# Altium footprint library IC.PCBLIB: 359 footprints (part 3 of 23)
Each footprint in its own frame and in the unit in brackets; x right, y up, seen from the top. Pads: shape width x height; smd on the part's side, far side on the other; paste and mask are expansions set on the pad; w line width, h text height; cw(c..) or ccw(c..) is an arc to the next point about the centre after c.
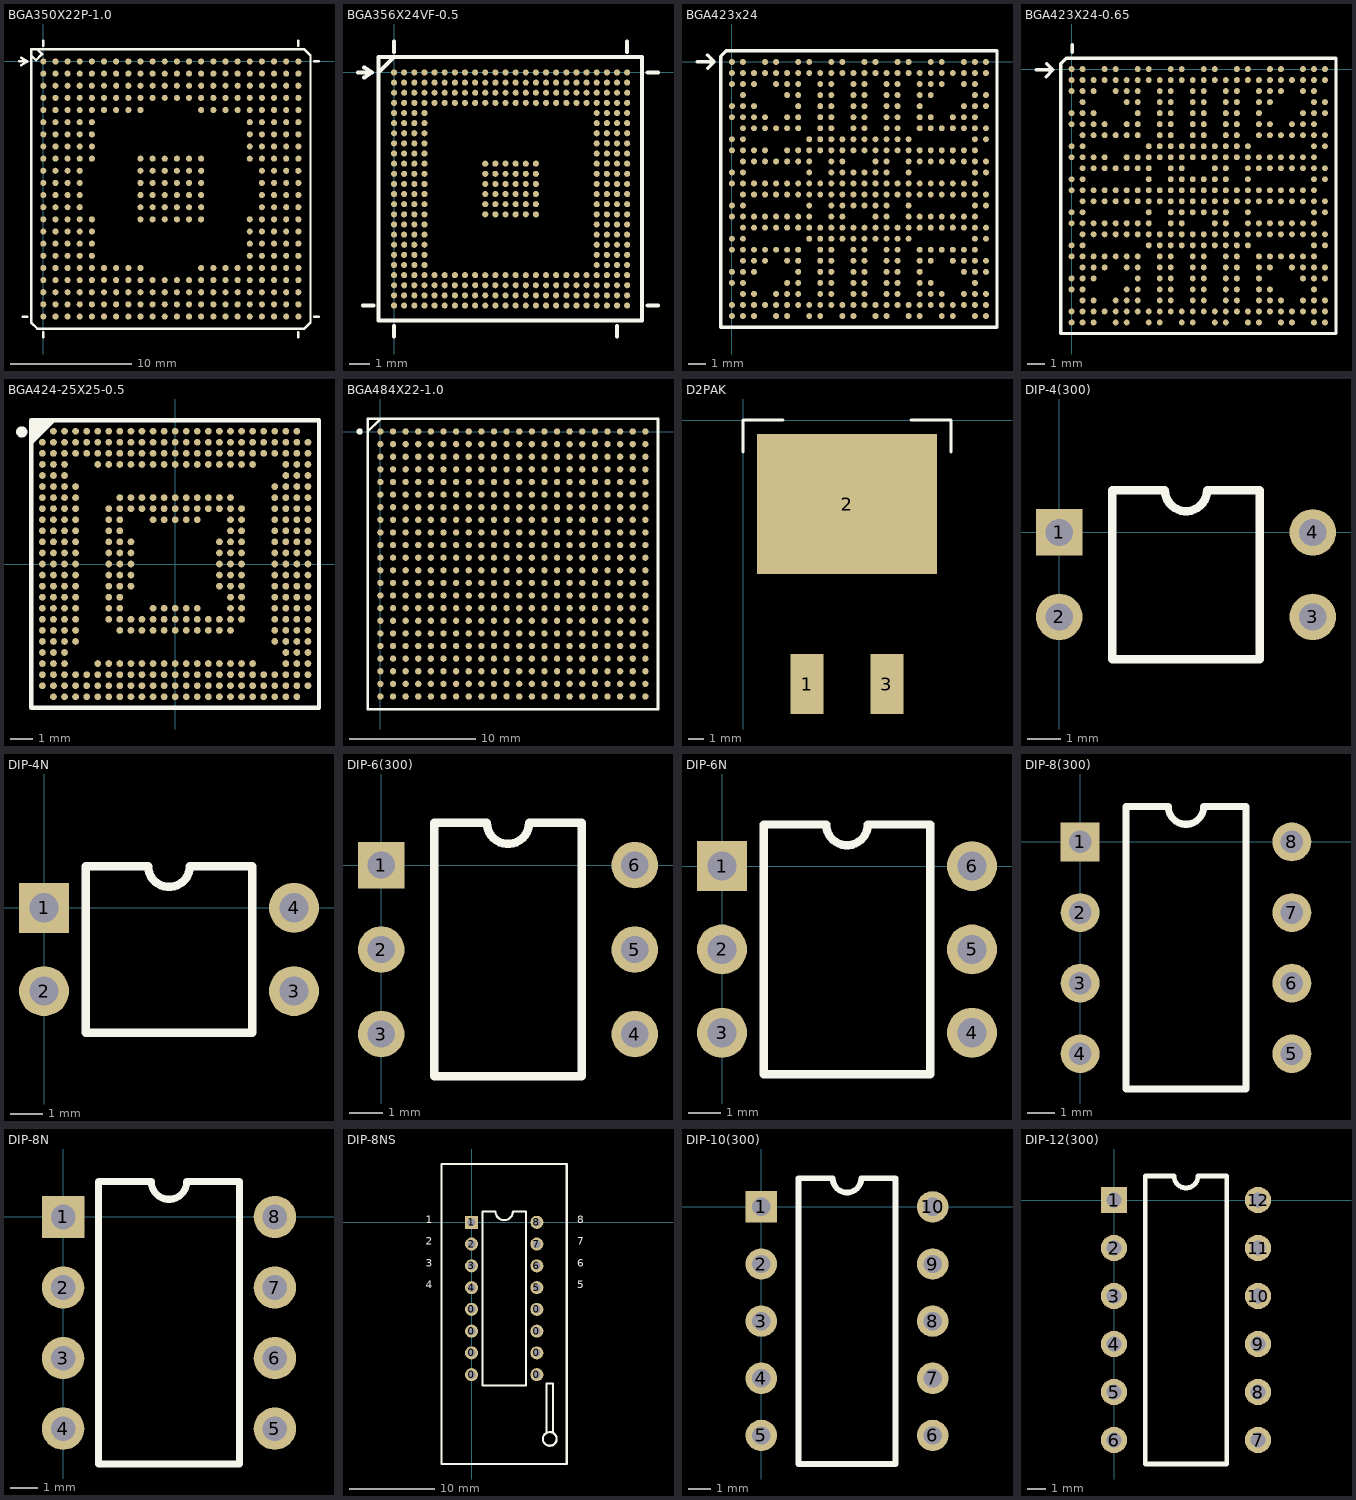
[diagram p2: the footprints below, top view; thin cyan lines are the x and y axes]

## BGA350X22P-1.0 [mm]
height 1.524
pads (360):
  round 0.5 smd: A1(0,0) A2(1,0) A3(2,0) A4(3,0) A5(4,0) A6(5,0) A7(6,0) A8(7,0) A9(8,0) A10(9,0) A11(10,0) A12(11,0) A13(12,0) A14(13,0) A15(14,0) A16(15,0) A17(16,0) A18(17,0) A19(18,0) A20(19,0) A21(20,0) A22(21,0) AA1(0,-20) AA2(1,-20) AA3(2,-20) AA4(3,-20) AA5(4,-20) AA6(5,-20) AA7(6,-20) AA8(7,-20) AA9(8,-20) AA10(9,-20) AA11(10,-20) AA12(11,-20) AA13(12,-20) AA14(13,-20) AA15(14,-20) AA16(15,-20) AA17(16,-20) AA18(17,-20) AA19(18,-20) AA20(19,-20) AA21(20,-20) AA22(21,-20) AB1(0,-21) AB2(1,-21) AB3(2,-21) AB4(3,-21) AB5(4,-21) AB6(5,-21) AB7(6,-21) AB8(7,-21) AB9(8,-21) AB10(9,-21) AB11(10,-21) AB12(11,-21) AB13(12,-21) AB14(13,-21) AB15(14,-21) AB16(15,-21) AB17(16,-21) AB18(17,-21) AB19(18,-21) AB20(19,-21) AB21(20,-21) AB22(21,-21) B1(0,-1) B2(1,-1) B3(2,-1) B4(3,-1) B5(4,-1) B6(5,-1) B7(6,-1) B8(7,-1) B9(8,-1) B10(9,-1) B11(10,-1) B12(11,-1) B13(12,-1) B14(13,-1) B15(14,-1) B16(15,-1) B17(16,-1) B18(17,-1) B19(18,-1) B20(19,-1) B21(20,-1) B22(21,-1) C1(0,-2) C2(1,-2) C3(2,-2) C4(3,-2) C5(4,-2) C6(5,-2) C7(6,-2) C8(7,-2) C9(8,-2) C10(9,-2) C11(10,-2) C12(11,-2) C13(12,-2) C14(13,-2) C15(14,-2) C16(15,-2) C17(16,-2) C18(17,-2) C19(18,-2) C20(19,-2) C21(20,-2) C22(21,-2) D1(0,-3) D2(1,-3) D3(2,-3) D4(3,-3) D5(4,-3) D6(5,-3) D7(6,-3) D8(7,-3) D9(8,-3) D10(9,-3) D11(10,-3) D12(11,-3) D13(12,-3) D14(13,-3) D15(14,-3) D16(15,-3) D17(16,-3) D18(17,-3) D19(18,-3) D20(19,-3) D21(20,-3) D22(21,-3) E1(0,-4) E2(1,-4) E3(2,-4) E4(3,-4) E5(4,-4) E6(5,-4) E7(6,-4) E8(7,-4) E9(8,-4) E14(13,-4) E15(14,-4) E16(15,-4) E17(16,-4) E18(17,-4) E19(18,-4) E20(19,-4) E21(20,-4) E22(21,-4) F1(0,-5) F2(1,-5) F3(2,-5) F4(3,-5) F5(4,-5) F18(17,-5) F19(18,-5) F20(19,-5) F21(20,-5) F22(21,-5) G1(0,-6) G2(1,-6) G3(2,-6) G4(3,-6) G5(4,-6) G18(17,-6) G19(18,-6) G20(19,-6) G21(20,-6) G22(21,-6) H1(0,-7) H2(1,-7) H3(2,-7) H4(3,-7) H5(4,-7) H18(17,-7) H19(18,-7) H20(19,-7) H21(20,-7) H22(21,-7) J1(0,-8) J2(1,-8) J3(2,-8) J4(3,-8) J5(4,-8) J9(8,-8) J10(9,-8) J11(10,-8) J12(11,-8) J13(12,-8) J14(13,-8) J18(17,-8) J19(18,-8) J20(19,-8) J21(20,-8) J22(21,-8) K1(0,-9) K2(1,-9) K3(2,-9) K4(3,-9) K9(8,-9) K10(9,-9) K11(10,-9) K12(11,-9) K13(12,-9) K14(13,-9) K19(18,-9) K20(19,-9) K21(20,-9) K22(21,-9) L1(0,-10) L2(1,-10) L3(2,-10) L4(3,-10) L9(8,-10) L10(9,-10) L11(10,-10) L12(11,-10) L13(12,-10) L14(13,-10) L19(18,-10) L20(19,-10) L21(20,-10) L22(21,-10) M1(0,-11) M2(1,-11) M3(2,-11) M4(3,-11) M9(8,-11) M10(9,-11) M11(10,-11) M12(11,-11) M13(12,-11) M14(13,-11) M19(18,-11) M20(19,-11) M21(20,-11) M22(21,-11) N1(0,-12) N2(1,-12) N3(2,-12) N4(3,-12) N9(8,-12) N10(9,-12) N11(10,-12) N12(11,-12) N13(12,-12) N14(13,-12) N19(18,-12) N20(19,-12) N21(20,-12) N22(21,-12) P1(0,-13) P2(1,-13) P3(2,-13) P4(3,-13) P5(4,-13) P9(8,-13) P10(9,-13) P11(10,-13) P12(11,-13) P13(12,-13) P14(13,-13) P18(17,-13) P19(18,-13) P20(19,-13) P21(20,-13) P22(21,-13) R1(0,-14) R2(1,-14) R3(2,-14) R4(3,-14) R5(4,-14) R18(17,-14) R19(18,-14) R20(19,-14) R21(20,-14) R22(21,-14) T1(0,-15) T2(1,-15) T3(2,-15) T4(3,-15) T5(4,-15) T18(17,-15) T19(18,-15) T20(19,-15) T21(20,-15) T22(21,-15) U1(0,-16) U2(1,-16) U3(2,-16) U4(3,-16) U5(4,-16) U18(17,-16) U19(18,-16) U20(19,-16) U21(20,-16) U22(21,-16) V1(0,-17) V2(1,-17) V3(2,-17) V4(3,-17) V5(4,-17) V6(5,-17) V7(6,-17) V8(7,-17) V9(8,-17) V14(13,-17) V15(14,-17) V16(15,-17) V17(16,-17) V18(17,-17) V19(18,-17) V20(19,-17) V21(20,-17) V22(21,-17) W1(0,-18) W2(1,-18) W3(2,-18) W4(3,-18) W5(4,-18) W6(5,-18) W7(6,-18) W8(7,-18) W9(8,-18) W10(9,-18) W11(10,-18) W12(11,-18) W13(12,-18) W14(13,-18) W15(14,-18) W16(15,-18) W17(16,-18) W18(17,-18) W19(18,-18) W20(19,-18) W21(20,-18) W22(21,-18) Y1(0,-19) Y2(1,-19) Y3(2,-19) Y4(3,-19) Y5(4,-19) Y6(5,-19) Y7(6,-19) Y8(7,-19) Y9(8,-19) Y10(9,-19) Y11(10,-19) Y12(11,-19) Y13(12,-19) Y14(13,-19) Y15(14,-19) Y16(15,-19) Y17(16,-19) Y18(17,-19) Y19(18,-19) Y20(19,-19) Y21(20,-19) Y22(21,-19)
TopOverlay:
  lines w0.2: -1,-21.5 -0.5,-22 21.5,-22 22,-21.5 22,0.5 21.5,1 -1,1 -1,-21.5
  lines w0.203: -2,0 -1.3,0 ; -1.8,-0.3 -1.3,0 ; -1.8,0.3 -1.3,0 ; -1.7,-21 -1.3,-21 ; -1,0.5 -0.6,0.1 -0.1,0.6 -0.5,1 ; 0,-22.7 0,-22.3 ; 0,1.3 0,1.7 ; 21,-22.7 21,-22.3 ; 21,1.3 21,1.7 ; 22.3,-21 22.7,-21 ; 22.3,0 22.7,0

## BGA356X24VF-0.5 [mm]
height 1.27
pads (356):
  round 0.3 smd: A1(0,0) A2(0.5,0) A3(1,0) A4(1.5,0) A5(2,0) A6(2.5,0) A7(3,0) A8(3.5,0) A9(4,0) A10(4.5,0) A11(5,0) A12(5.5,0) A13(6,0) A14(6.5,0) A15(7,0) A16(7.5,0) A17(8,0) A18(8.5,0) A19(9,0) A20(9.5,0) A21(10,0) A22(10.5,0) A23(11,0) A24(11.5,0) AA1(0,-10) AA2(0.5,-10) AA3(1,-10) AA4(1.5,-10) AA5(2,-10) AA6(2.5,-10) AA7(3,-10) AA8(3.5,-10) AA9(4,-10) AA10(4.5,-10) AA11(5,-10) AA12(5.5,-10) AA13(6,-10) AA14(6.5,-10) AA15(7,-10) AA16(7.5,-10) AA17(8,-10) AA18(8.5,-10) AA19(9,-10) AA20(9.5,-10) AA21(10,-10) AA22(10.5,-10) AA23(11,-10) AA24(11.5,-10) AB1(0,-10.5) AB2(0.5,-10.5) AB3(1,-10.5) AB4(1.5,-10.5) AB5(2,-10.5) AB6(2.5,-10.5) AB7(3,-10.5) AB8(3.5,-10.5) AB9(4,-10.5) AB10(4.5,-10.5) AB11(5,-10.5) AB12(5.5,-10.5) AB13(6,-10.5) AB14(6.5,-10.5) AB15(7,-10.5) AB16(7.5,-10.5) AB17(8,-10.5) AB18(8.5,-10.5) AB19(9,-10.5) AB20(9.5,-10.5) AB21(10,-10.5) AB22(10.5,-10.5) AB23(11,-10.5) AB24(11.5,-10.5) AC1(0,-11) AC2(0.5,-11) AC3(1,-11) AC4(1.5,-11) AC5(2,-11) AC6(2.5,-11) AC7(3,-11) AC8(3.5,-11) AC9(4,-11) AC10(4.5,-11) AC11(5,-11) AC12(5.5,-11) AC13(6,-11) AC14(6.5,-11) AC15(7,-11) AC16(7.5,-11) AC17(8,-11) AC18(8.5,-11) AC19(9,-11) AC20(9.5,-11) AC21(10,-11) AC22(10.5,-11) AC23(11,-11) AC24(11.5,-11) AD1(0,-11.5) AD2(0.5,-11.5) AD3(1,-11.5) AD4(1.5,-11.5) AD5(2,-11.5) AD6(2.5,-11.5) AD7(3,-11.5) AD8(3.5,-11.5) AD9(4,-11.5) AD10(4.5,-11.5) AD11(5,-11.5) AD12(5.5,-11.5) AD13(6,-11.5) AD14(6.5,-11.5) AD15(7,-11.5) AD16(7.5,-11.5) AD17(8,-11.5) AD18(8.5,-11.5) AD19(9,-11.5) AD20(9.5,-11.5) AD21(10,-11.5) AD22(10.5,-11.5) AD23(11,-11.5) AD24(11.5,-11.5) B1(0,-0.5) B2(0.5,-0.5) B3(1,-0.5) B4(1.5,-0.5) B5(2,-0.5) B6(2.5,-0.5) B7(3,-0.5) B8(3.5,-0.5) B9(4,-0.5) B10(4.5,-0.5) B11(5,-0.5) B12(5.5,-0.5) B13(6,-0.5) B14(6.5,-0.5) B15(7,-0.5) B16(7.5,-0.5) B17(8,-0.5) B18(8.5,-0.5) B19(9,-0.5) B20(9.5,-0.5) B21(10,-0.5) B22(10.5,-0.5) B23(11,-0.5) B24(11.5,-0.5) C1(0,-1) C2(0.5,-1) C3(1,-1) C4(1.5,-1) C5(2,-1) C6(2.5,-1) C7(3,-1) C8(3.5,-1) C9(4,-1) C10(4.5,-1) C11(5,-1) C12(5.5,-1) C13(6,-1) C14(6.5,-1) C15(7,-1) C16(7.5,-1) C17(8,-1) C18(8.5,-1) C19(9,-1) C20(9.5,-1) C21(10,-1) C22(10.5,-1) C23(11,-1) C24(11.5,-1) D1(0,-1.5) D2(0.5,-1.5) D3(1,-1.5) D4(1.5,-1.5) D5(2,-1.5) D6(2.5,-1.5) D7(3,-1.5) D8(3.5,-1.5) D9(4,-1.5) D10(4.5,-1.5) D11(5,-1.5) D12(5.5,-1.5) D13(6,-1.5) D14(6.5,-1.5) D15(7,-1.5) D16(7.5,-1.5) D17(8,-1.5) D18(8.5,-1.5) D19(9,-1.5) D20(9.5,-1.5) D21(10,-1.5) D22(10.5,-1.5) D23(11,-1.5) D24(11.5,-1.5) E1(0,-2) E2(0.5,-2) E3(1,-2) E4(1.5,-2) E21(10,-2) E22(10.5,-2) E23(11,-2) E24(11.5,-2) F1(0,-2.5) F2(0.5,-2.5) F3(1,-2.5) F4(1.5,-2.5) F21(10,-2.5) F22(10.5,-2.5) F23(11,-2.5) F24(11.5,-2.5) G1(0,-3) G2(0.5,-3) G3(1,-3) G4(1.5,-3) G21(10,-3) G22(10.5,-3) G23(11,-3) G24(11.5,-3) H1(0,-3.5) H2(0.5,-3.5) H3(1,-3.5) H4(1.5,-3.5) H21(10,-3.5) H22(10.5,-3.5) H23(11,-3.5) H24(11.5,-3.5) J1(0,-4) J2(0.5,-4) J3(1,-4) J4(1.5,-4) J21(10,-4) J22(10.5,-4) J23(11,-4) J24(11.5,-4) K1(0,-4.5) K2(0.5,-4.5) K3(1,-4.5) K4(1.5,-4.5) K10(4.5,-4.5) K11(5,-4.5) K12(5.5,-4.5) K13(6,-4.5) K14(6.5,-4.5) K15(7,-4.5) K21(10,-4.5) K22(10.5,-4.5) K23(11,-4.5) K24(11.5,-4.5) L1(0,-5) L2(0.5,-5) L3(1,-5) L4(1.5,-5) L10(4.5,-5) L11(5,-5) L12(5.5,-5) L13(6,-5) L14(6.5,-5) L15(7,-5) L21(10,-5) L22(10.5,-5) L23(11,-5) L24(11.5,-5) M1(0,-5.5) M2(0.5,-5.5) M3(1,-5.5) M4(1.5,-5.5) M10(4.5,-5.5) M11(5,-5.5) M12(5.5,-5.5) M13(6,-5.5) M14(6.5,-5.5) M15(7,-5.5) M21(10,-5.5) M22(10.5,-5.5) M23(11,-5.5) M24(11.5,-5.5) N1(0,-6) N2(0.5,-6) N3(1,-6) N4(1.5,-6) N10(4.5,-6) N11(5,-6) N12(5.5,-6) N13(6,-6) N14(6.5,-6) N15(7,-6) N21(10,-6) N22(10.5,-6) N23(11,-6) N24(11.5,-6) P1(0,-6.5) P2(0.5,-6.5) P3(1,-6.5) P4(1.5,-6.5) P10(4.5,-6.5) P11(5,-6.5) P12(5.5,-6.5) P13(6,-6.5) P14(6.5,-6.5) P15(7,-6.5) P21(10,-6.5) P22(10.5,-6.5) P23(11,-6.5) P24(11.5,-6.5) R1(0,-7) R2(0.5,-7) R3(1,-7) R4(1.5,-7) R10(4.5,-7) R11(5,-7) R12(5.5,-7) R13(6,-7) R14(6.5,-7) R15(7,-7) R21(10,-7) R22(10.5,-7) R23(11,-7) R24(11.5,-7) T1(0,-7.5) T2(0.5,-7.5) T3(1,-7.5) T4(1.5,-7.5) T21(10,-7.5) T22(10.5,-7.5) T23(11,-7.5) T24(11.5,-7.5) U1(0,-8) U2(0.5,-8) U3(1,-8) U4(1.5,-8) U21(10,-8) U22(10.5,-8) U23(11,-8) U24(11.5,-8) V1(0,-8.5) V2(0.5,-8.5) V3(1,-8.5) V4(1.5,-8.5) V21(10,-8.5) V22(10.5,-8.5) V23(11,-8.5) V24(11.5,-8.5) W1(0,-9) W2(0.5,-9) W3(1,-9) W4(1.5,-9) W21(10,-9) W22(10.5,-9) W23(11,-9) W24(11.5,-9) Y1(0,-9.5) Y2(0.5,-9.5) Y3(1,-9.5) Y4(1.5,-9.5) Y21(10,-9.5) Y22(10.5,-9.5) Y23(11,-9.5) Y24(11.5,-9.5)
TopOverlay:
  lines w0.203: -1.778,0 -1.092,0 ; -1.524,-11.5 -1.016,-11.5 ; -1.473,-0.254 -1.092,0 ; -1.473,0.254 -1.092,0 ; -0.762,0 0,0.762 ; 0,-13.024 0,-12.516 ; 0,1.016 0,1.524 ; 11,-13.024 11,-12.516 ; 11.5,1.016 11.5,1.524 ; 12.516,-11.5 13.024,-11.5 ; 12.516,0 13.024,0 ; -0.762,-12.243 -0.762,0.762 12.243,0.762 12.243,-12.243 -0.762,-12.243

## BGA423x24 [mm]
pads (423):
  round 0.35 smd: A1(0,0) A2(0.65,0) A4(1.95,0) A5(2.6,0) A7(3.9,0) A8(4.55,0) A10(5.85,0) A11(6.5,0) A13(7.8,0) A14(8.45,0) A16(9.75,0) A17(10.4,0) A19(11.7,0) A20(12.35,0) A22(13.65,0) A23(14.3,0) A24(14.95,0) AA1(0,-13) AA2(0.65,-13) AA6(3.25,-13) AA7(3.9,-13) AA9(5.2,-13) AA10(5.85,-13) AA12(7.15,-13) AA13(7.8,-13) AA15(9.1,-13) AA16(9.75,-13) AA18(11.05,-13) AA19(11.7,-13) AA23(14.3,-13) AB2(0.65,-13.65) AB3(1.3,-13.65) AB5(2.6,-13.65) AB6(3.25,-13.65) AB7(3.9,-13.65) AB9(5.2,-13.65) AB10(5.85,-13.65) AB12(7.15,-13.65) AB13(7.8,-13.65) AB15(9.1,-13.65) AB16(9.75,-13.65) AB18(11.05,-13.65) AB19(11.7,-13.65) AB20(12.35,-13.65) AB22(13.65,-13.65) AB23(14.3,-13.65) AB24(14.95,-13.65) AC1(0,-14.3) AC2(0.65,-14.3) AC3(1.3,-14.3) AC4(1.95,-14.3) AC5(2.6,-14.3) AC6(3.25,-14.3) AC7(3.9,-14.3) AC8(4.55,-14.3) AC9(5.2,-14.3) AC10(5.85,-14.3) AC11(6.5,-14.3) AC12(7.15,-14.3) AC13(7.8,-14.3) AC14(8.45,-14.3) AC15(9.1,-14.3) AC16(9.75,-14.3) AC17(10.4,-14.3) AC18(11.05,-14.3) AC19(11.7,-14.3) AC20(12.35,-14.3) AC21(13,-14.3) AC22(13.65,-14.3) AC23(14.3,-14.3) AC24(14.95,-14.3) AD1(0,-14.95) AD2(0.65,-14.95) AD3(1.3,-14.95) AD5(2.6,-14.95) AD6(3.25,-14.95) AD8(4.55,-14.95) AD9(5.2,-14.95) AD11(6.5,-14.95) AD12(7.15,-14.95) AD14(8.45,-14.95) AD15(9.1,-14.95) AD17(10.4,-14.95) AD18(11.05,-14.95) AD20(12.35,-14.95) AD21(13,-14.95) AD23(14.3,-14.95) AD24(14.95,-14.95) B1(0,-0.65) B2(0.65,-0.65) B3(1.3,-0.65) B4(1.95,-0.65) B5(2.6,-0.65) B6(3.25,-0.65) B7(3.9,-0.65) B8(4.55,-0.65) B9(5.2,-0.65) B10(5.85,-0.65) B11(6.5,-0.65) B12(7.15,-0.65) B13(7.8,-0.65) B14(8.45,-0.65) B15(9.1,-0.65) B16(9.75,-0.65) B17(10.4,-0.65) B18(11.05,-0.65) B19(11.7,-0.65) B20(12.35,-0.65) B21(13,-0.65) B22(13.65,-0.65) B23(14.3,-0.65) B24(14.95,-0.65) C1(0,-1.3) C2(0.65,-1.3) C3(1.3,-1.3) C5(2.6,-1.3) C6(3.25,-1.3) C7(3.9,-1.3) C9(5.2,-1.3) C10(5.85,-1.3) C12(7.15,-1.3) C13(7.8,-1.3) C15(9.1,-1.3) C16(9.75,-1.3) C18(11.05,-1.3) C19(11.7,-1.3) C20(12.35,-1.3) C22(13.65,-1.3) C23(14.3,-1.3) D2(0.65,-1.95) D6(3.25,-1.95) D7(3.9,-1.95) D9(5.2,-1.95) D10(5.85,-1.95) D12(7.15,-1.95) D13(7.8,-1.95) D15(9.1,-1.95) D16(9.75,-1.95) D18(11.05,-1.95) D19(11.7,-1.95) D23(14.3,-1.95) D24(14.95,-1.95) E1(0,-2.6) E2(0.65,-2.6) E3(1.3,-2.6) E7(3.9,-2.6) E9(5.2,-2.6) E10(5.85,-2.6) E12(7.15,-2.6) E13(7.8,-2.6) E15(9.1,-2.6) E16(9.75,-2.6) E18(11.05,-2.6) E22(13.65,-2.6) E23(14.3,-2.6) E24(14.95,-2.6) F1(0,-3.25) F2(0.65,-3.25) F3(1.3,-3.25) F4(1.95,-3.25) F6(3.25,-3.25) F7(3.9,-3.25) F9(5.2,-3.25) F10(5.85,-3.25) F12(7.15,-3.25) F13(7.8,-3.25) F15(9.1,-3.25) F16(9.75,-3.25) F18(11.05,-3.25) F19(11.7,-3.25) F21(13,-3.25) F22(13.65,-3.25) F23(14.3,-3.25) G2(0.65,-3.9) G3(1.3,-3.9) G4(1.95,-3.9) G5(2.6,-3.9) G6(3.25,-3.9) G7(3.9,-3.9) G9(5.2,-3.9) G10(5.85,-3.9) G12(7.15,-3.9) G13(7.8,-3.9) G15(9.1,-3.9) G16(9.75,-3.9) G18(11.05,-3.9) G19(11.7,-3.9) G20(12.35,-3.9) G21(13,-3.9) G22(13.65,-3.9) G23(14.3,-3.9) G24(14.95,-3.9) H1(0,-4.55) H2(0.65,-4.55) H8(4.55,-4.55) H9(5.2,-4.55) H10(5.85,-4.55) H11(6.5,-4.55) H12(7.15,-4.55) H13(7.8,-4.55) H14(8.45,-4.55) H15(9.1,-4.55) H16(9.75,-4.55) H17(10.4,-4.55) H23(14.3,-4.55) H24(14.95,-4.55) J1(0,-5.2) J2(0.65,-5.2) J3(1.3,-5.2) J4(1.95,-5.2) J6(3.25,-5.2) J7(3.9,-5.2) J8(4.55,-5.2) J9(5.2,-5.2) J10(5.85,-5.2) J11(6.5,-5.2) J12(7.15,-5.2) J13(7.8,-5.2) J14(8.45,-5.2) J15(9.1,-5.2) J16(9.75,-5.2) J17(10.4,-5.2) J18(11.05,-5.2) J19(11.7,-5.2) J20(12.35,-5.2) J21(13,-5.2) J22(13.65,-5.2) J23(14.3,-5.2) K2(0.65,-5.85) K3(1.3,-5.85) K4(1.95,-5.85) K5(2.6,-5.85) K6(3.25,-5.85) K7(3.9,-5.85) K8(4.55,-5.85) K10(5.85,-5.85) K11(6.5,-5.85) K14(8.45,-5.85) K15(9.1,-5.85) K17(10.4,-5.85) K18(11.05,-5.85) K19(11.7,-5.85) K20(12.35,-5.85) K21(13,-5.85) K22(13.65,-5.85) K23(14.3,-5.85) K24(14.95,-5.85) L1(0,-6.5) L2(0.65,-6.5) L8(4.55,-6.5) L10(5.85,-6.5) L11(6.5,-6.5) L12(7.15,-6.5) L13(7.8,-6.5) L14(8.45,-6.5) L15(9.1,-6.5) L17(10.4,-6.5) L23(14.3,-6.5) L24(14.95,-6.5) M1(0,-7.15) M2(0.65,-7.15) M3(1.3,-7.15) M4(1.95,-7.15) M5(2.6,-7.15) M6(3.25,-7.15) M7(3.9,-7.15) M8(4.55,-7.15) M9(5.2,-7.15) M10(5.85,-7.15) M11(6.5,-7.15) M12(7.15,-7.15) M13(7.8,-7.15) M14(8.45,-7.15) M15(9.1,-7.15) M16(9.75,-7.15) M17(10.4,-7.15) M18(11.05,-7.15) M19(11.7,-7.15) M20(12.35,-7.15) M21(13,-7.15) M22(13.65,-7.15) M23(14.3,-7.15) N2(0.65,-7.8) N3(1.3,-7.8) N4(1.95,-7.8) N5(2.6,-7.8) N6(3.25,-7.8) N7(3.9,-7.8) N8(4.55,-7.8) N9(5.2,-7.8) N10(5.85,-7.8) N11(6.5,-7.8) N12(7.15,-7.8) N13(7.8,-7.8) N14(8.45,-7.8) N15(9.1,-7.8) N16(9.75,-7.8) N17(10.4,-7.8) N18(11.05,-7.8) N19(11.7,-7.8) N20(12.35,-7.8) N21(13,-7.8) N22(13.65,-7.8) N23(14.3,-7.8) N24(14.95,-7.8) P1(0,-8.45) P2(0.65,-8.45) P8(4.55,-8.45) P10(5.85,-8.45) P11(6.5,-8.45) P12(7.15,-8.45) P13(7.8,-8.45) P14(8.45,-8.45) P15(9.1,-8.45) P17(10.4,-8.45) P23(14.3,-8.45) P24(14.95,-8.45) R1(0,-9.1) R2(0.65,-9.1) R3(1.3,-9.1) R4(1.95,-9.1) R5(2.6,-9.1) R6(3.25,-9.1) R7(3.9,-9.1) R8(4.55,-9.1) R10(5.85,-9.1) R11(6.5,-9.1) R14(8.45,-9.1) R15(9.1,-9.1) R17(10.4,-9.1) R18(11.05,-9.1) R19(11.7,-9.1) R20(12.35,-9.1) R21(13,-9.1) R22(13.65,-9.1) R23(14.3,-9.1) T2(0.65,-9.75) T3(1.3,-9.75) T4(1.95,-9.75) T5(2.6,-9.75) T6(3.25,-9.75) T7(3.9,-9.75) T8(4.55,-9.75) T9(5.2,-9.75) T10(5.85,-9.75) T11(6.5,-9.75) T12(7.15,-9.75) T13(7.8,-9.75) T14(8.45,-9.75) T15(9.1,-9.75) T16(9.75,-9.75) T17(10.4,-9.75) T18(11.05,-9.75) T19(11.7,-9.75) T20(12.35,-9.75) T21(13,-9.75) T22(13.65,-9.75) T23(14.3,-9.75) T24(14.95,-9.75) U1(0,-10.4) U2(0.65,-10.4) U8(4.55,-10.4) U9(5.2,-10.4) U10(5.85,-10.4) U11(6.5,-10.4) U12(7.15,-10.4) U13(7.8,-10.4) U14(8.45,-10.4) U15(9.1,-10.4) U16(9.75,-10.4) U17(10.4,-10.4) U23(14.3,-10.4) U24(14.95,-10.4) V1(0,-11.05) V2(0.65,-11.05) V3(1.3,-11.05) V4(1.95,-11.05) V5(2.6,-11.05) V6(3.25,-11.05) V7(3.9,-11.05) V9(5.2,-11.05) V10(5.85,-11.05) V12(7.15,-11.05) V13(7.8,-11.05) V15(9.1,-11.05) V16(9.75,-11.05) V18(11.05,-11.05) V19(11.7,-11.05) V20(12.35,-11.05) V21(13,-11.05) V22(13.65,-11.05) V23(14.3,-11.05) W2(0.65,-11.7) W3(1.3,-11.7) W4(1.95,-11.7) W6(3.25,-11.7) W7(3.9,-11.7) W9(5.2,-11.7) W10(5.85,-11.7) W12(7.15,-11.7) W13(7.8,-11.7) W15(9.1,-11.7) W16(9.75,-11.7) W18(11.05,-11.7) W19(11.7,-11.7) W21(13,-11.7) W22(13.65,-11.7) W23(14.3,-11.7) W24(14.95,-11.7) Y1(0,-12.35) Y2(0.65,-12.35) Y3(1.3,-12.35) Y7(3.9,-12.35) Y9(5.2,-12.35) Y10(5.85,-12.35) Y12(7.15,-12.35) Y13(7.8,-12.35) Y15(9.1,-12.35) Y16(9.75,-12.35) Y18(11.05,-12.35) Y22(13.65,-12.35) Y23(14.3,-12.35) Y24(14.95,-12.35)
TopOverlay:
  lines w0.2: -2.054,0.013 -1.054,0.013 ; -1.454,0.413 -1.054,0.013 ; -1.429,-0.362 -1.054,0.013 ; -0.65,-15.6 -0.65,0.325 -0.325,0.65 15.6,0.65 15.6,-15.6 -0.65,-15.6

## BGA423X24-0.65 [mm]
height 1.27
pads (423):
  round 0.35 smd: A1(0,0) A2(0.65,0) A4(1.95,0) A5(2.6,0) A7(3.9,0) A8(4.55,0) A10(5.85,0) A11(6.5,0) A13(7.8,0) A14(8.45,0) A16(9.75,0) A17(10.4,0) A19(11.7,0) A20(12.35,0) A22(13.65,0) A23(14.3,0) A24(14.95,0) AA1(0,-13) AA2(0.65,-13) AA6(3.25,-13) AA7(3.9,-13) AA9(5.2,-13) AA10(5.85,-13) AA12(7.15,-13) AA13(7.8,-13) AA15(9.1,-13) AA16(9.75,-13) AA18(11.05,-13) AA19(11.7,-13) AA23(14.3,-13) AB2(0.65,-13.65) AB3(1.3,-13.65) AB5(2.6,-13.65) AB6(3.25,-13.65) AB7(3.9,-13.65) AB9(5.2,-13.65) AB10(5.85,-13.65) AB12(7.15,-13.65) AB13(7.8,-13.65) AB15(9.1,-13.65) AB16(9.75,-13.65) AB18(11.05,-13.65) AB19(11.7,-13.65) AB20(12.35,-13.65) AB22(13.65,-13.65) AB23(14.3,-13.65) AB24(14.95,-13.65) AC1(0,-14.3) AC2(0.65,-14.3) AC3(1.3,-14.3) AC4(1.95,-14.3) AC5(2.6,-14.3) AC6(3.25,-14.3) AC7(3.9,-14.3) AC8(4.55,-14.3) AC9(5.2,-14.3) AC10(5.85,-14.3) AC11(6.5,-14.3) AC12(7.15,-14.3) AC13(7.8,-14.3) AC14(8.45,-14.3) AC15(9.1,-14.3) AC16(9.75,-14.3) AC17(10.4,-14.3) AC18(11.05,-14.3) AC19(11.7,-14.3) AC20(12.35,-14.3) AC21(13,-14.3) AC22(13.65,-14.3) AC23(14.3,-14.3) AC24(14.95,-14.3) AD1(0,-14.95) AD2(0.65,-14.95) AD3(1.3,-14.95) AD5(2.6,-14.95) AD6(3.25,-14.95) AD8(4.55,-14.95) AD9(5.2,-14.95) AD11(6.5,-14.95) AD12(7.15,-14.95) AD14(8.45,-14.95) AD15(9.1,-14.95) AD17(10.4,-14.95) AD18(11.05,-14.95) AD20(12.35,-14.95) AD21(13,-14.95) AD23(14.3,-14.95) AD24(14.95,-14.95) B1(0,-0.65) B2(0.65,-0.65) B3(1.3,-0.65) B4(1.95,-0.65) B5(2.6,-0.65) B6(3.25,-0.65) B7(3.9,-0.65) B8(4.55,-0.65) B9(5.2,-0.65) B10(5.85,-0.65) B11(6.5,-0.65) B12(7.15,-0.65) B13(7.8,-0.65) B14(8.45,-0.65) B15(9.1,-0.65) B16(9.75,-0.65) B17(10.4,-0.65) B18(11.05,-0.65) B19(11.7,-0.65) B20(12.35,-0.65) B21(13,-0.65) B22(13.65,-0.65) B23(14.3,-0.65) B24(14.95,-0.65) C1(0,-1.3) C2(0.65,-1.3) C3(1.3,-1.3) C5(2.6,-1.3) C6(3.25,-1.3) C7(3.9,-1.3) C9(5.2,-1.3) C10(5.85,-1.3) C12(7.15,-1.3) C13(7.8,-1.3) C15(9.1,-1.3) C16(9.75,-1.3) C18(11.05,-1.3) C19(11.7,-1.3) C20(12.35,-1.3) C22(13.65,-1.3) C23(14.3,-1.3) D2(0.65,-1.95) D6(3.25,-1.95) D7(3.9,-1.95) D9(5.2,-1.95) D10(5.85,-1.95) D12(7.15,-1.95) D13(7.8,-1.95) D15(9.1,-1.95) D16(9.75,-1.95) D18(11.05,-1.95) D19(11.7,-1.95) D23(14.3,-1.95) D24(14.95,-1.95) E1(0,-2.6) E2(0.65,-2.6) E3(1.3,-2.6) E7(3.9,-2.6) E9(5.2,-2.6) E10(5.85,-2.6) E12(7.15,-2.6) E13(7.8,-2.6) E15(9.1,-2.6) E16(9.75,-2.6) E18(11.05,-2.6) E22(13.65,-2.6) E23(14.3,-2.6) E24(14.95,-2.6) F1(0,-3.25) F2(0.65,-3.25) F3(1.3,-3.25) F4(1.95,-3.25) F6(3.25,-3.25) F7(3.9,-3.25) F9(5.2,-3.25) F10(5.85,-3.25) F12(7.15,-3.25) F13(7.8,-3.25) F15(9.1,-3.25) F16(9.75,-3.25) F18(11.05,-3.25) F19(11.7,-3.25) F21(13,-3.25) F22(13.65,-3.25) F23(14.3,-3.25) G2(0.65,-3.9) G3(1.3,-3.9) G4(1.95,-3.9) G5(2.6,-3.9) G6(3.25,-3.9) G7(3.9,-3.9) G9(5.2,-3.9) G10(5.85,-3.9) G12(7.15,-3.9) G13(7.8,-3.9) G15(9.1,-3.9) G16(9.75,-3.9) G18(11.05,-3.9) G19(11.7,-3.9) G20(12.35,-3.9) G21(13,-3.9) G22(13.65,-3.9) G23(14.3,-3.9) G24(14.95,-3.9) H1(0,-4.55) H2(0.65,-4.55) H8(4.55,-4.55) H9(5.2,-4.55) H10(5.85,-4.55) H11(6.5,-4.55) H12(7.15,-4.55) H13(7.8,-4.55) H14(8.45,-4.55) H15(9.1,-4.55) H16(9.75,-4.55) H17(10.4,-4.55) H23(14.3,-4.55) H24(14.95,-4.55) J1(0,-5.2) J2(0.65,-5.2) J3(1.3,-5.2) J4(1.95,-5.2) J6(3.25,-5.2) J7(3.9,-5.2) J8(4.55,-5.2) J9(5.2,-5.2) J10(5.85,-5.2) J11(6.5,-5.2) J12(7.15,-5.2) J13(7.8,-5.2) J14(8.45,-5.2) J15(9.1,-5.2) J16(9.75,-5.2) J17(10.4,-5.2) J18(11.05,-5.2) J19(11.7,-5.2) J20(12.35,-5.2) J21(13,-5.2) J22(13.65,-5.2) J23(14.3,-5.2) K2(0.65,-5.85) K3(1.3,-5.85) K4(1.95,-5.85) K5(2.6,-5.85) K6(3.25,-5.85) K7(3.9,-5.85) K8(4.55,-5.85) K10(5.85,-5.85) K11(6.5,-5.85) K14(8.45,-5.85) K15(9.1,-5.85) K17(10.4,-5.85) K18(11.05,-5.85) K19(11.7,-5.85) K20(12.35,-5.85) K21(13,-5.85) K22(13.65,-5.85) K23(14.3,-5.85) K24(14.95,-5.85) L1(0,-6.5) L2(0.65,-6.5) L8(4.55,-6.5) L10(5.85,-6.5) L11(6.5,-6.5) L12(7.15,-6.5) L13(7.8,-6.5) L14(8.45,-6.5) L15(9.1,-6.5) L17(10.4,-6.5) L23(14.3,-6.5) L24(14.95,-6.5) M1(0,-7.15) M2(0.65,-7.15) M3(1.3,-7.15) M4(1.95,-7.15) M5(2.6,-7.15) M6(3.25,-7.15) M7(3.9,-7.15) M8(4.55,-7.15) M9(5.2,-7.15) M10(5.85,-7.15) M11(6.5,-7.15) M12(7.15,-7.15) M13(7.8,-7.15) M14(8.45,-7.15) M15(9.1,-7.15) M16(9.75,-7.15) M17(10.4,-7.15) M18(11.05,-7.15) M19(11.7,-7.15) M20(12.35,-7.15) M21(13,-7.15) M22(13.65,-7.15) M23(14.3,-7.15) N2(0.65,-7.8) N3(1.3,-7.8) N4(1.95,-7.8) N5(2.6,-7.8) N6(3.25,-7.8) N7(3.9,-7.8) N8(4.55,-7.8) N9(5.2,-7.8) N10(5.85,-7.8) N11(6.5,-7.8) N12(7.15,-7.8) N13(7.8,-7.8) N14(8.45,-7.8) N15(9.1,-7.8) N16(9.75,-7.8) N17(10.4,-7.8) N18(11.05,-7.8) N19(11.7,-7.8) N20(12.35,-7.8) N21(13,-7.8) N22(13.65,-7.8) N23(14.3,-7.8) N24(14.95,-7.8) P1(0,-8.45) P2(0.65,-8.45) P8(4.55,-8.45) P10(5.85,-8.45) P11(6.5,-8.45) P12(7.15,-8.45) P13(7.8,-8.45) P14(8.45,-8.45) P15(9.1,-8.45) P17(10.4,-8.45) P23(14.3,-8.45) P24(14.95,-8.45) R1(0,-9.1) R2(0.65,-9.1) R3(1.3,-9.1) R4(1.95,-9.1) R5(2.6,-9.1) R6(3.25,-9.1) R7(3.9,-9.1) R8(4.55,-9.1) R10(5.85,-9.1) R11(6.5,-9.1) R14(8.45,-9.1) R15(9.1,-9.1) R17(10.4,-9.1) R18(11.05,-9.1) R19(11.7,-9.1) R20(12.35,-9.1) R21(13,-9.1) R22(13.65,-9.1) R23(14.3,-9.1) T2(0.65,-9.75) T3(1.3,-9.75) T4(1.95,-9.75) T5(2.6,-9.75) T6(3.25,-9.75) T7(3.9,-9.75) T8(4.55,-9.75) T9(5.2,-9.75) T10(5.85,-9.75) T11(6.5,-9.75) T12(7.15,-9.75) T13(7.8,-9.75) T14(8.45,-9.75) T15(9.1,-9.75) T16(9.75,-9.75) T17(10.4,-9.75) T18(11.05,-9.75) T19(11.7,-9.75) T20(12.35,-9.75) T21(13,-9.75) T22(13.65,-9.75) T23(14.3,-9.75) T24(14.95,-9.75) U1(0,-10.4) U2(0.65,-10.4) U8(4.55,-10.4) U9(5.2,-10.4) U10(5.85,-10.4) U11(6.5,-10.4) U12(7.15,-10.4) U13(7.8,-10.4) U14(8.45,-10.4) U15(9.1,-10.4) U16(9.75,-10.4) U17(10.4,-10.4) U23(14.3,-10.4) U24(14.95,-10.4) V1(0,-11.05) V2(0.65,-11.05) V3(1.3,-11.05) V4(1.95,-11.05) V5(2.6,-11.05) V6(3.25,-11.05) V7(3.9,-11.05) V9(5.2,-11.05) V10(5.85,-11.05) V12(7.15,-11.05) V13(7.8,-11.05) V15(9.1,-11.05) V16(9.75,-11.05) V18(11.05,-11.05) V19(11.7,-11.05) V20(12.35,-11.05) V21(13,-11.05) V22(13.65,-11.05) V23(14.3,-11.05) W2(0.65,-11.7) W3(1.3,-11.7) W4(1.95,-11.7) W6(3.25,-11.7) W7(3.9,-11.7) W9(5.2,-11.7) W10(5.85,-11.7) W12(7.15,-11.7) W13(7.8,-11.7) W15(9.1,-11.7) W16(9.75,-11.7) W18(11.05,-11.7) W19(11.7,-11.7) W21(13,-11.7) W22(13.65,-11.7) W23(14.3,-11.7) W24(14.95,-11.7) Y1(0,-12.35) Y2(0.65,-12.35) Y3(1.3,-12.35) Y7(3.9,-12.35) Y9(5.2,-12.35) Y10(5.85,-12.35) Y12(7.15,-12.35) Y13(7.8,-12.35) Y15(9.1,-12.35) Y16(9.75,-12.35) Y18(11.05,-12.35) Y22(13.65,-12.35) Y23(14.3,-12.35) Y24(14.95,-12.35)